# Altium footprint library 电容封装库.PcbLib: 100 footprints (part 2 of 7)
Each footprint in its own frame and in the unit in brackets; x right, y up, seen from the top. Pads: shape width x height; smd on the part's side, far side on the other; paste and mask are expansions set on the pad; w line width, h text height; cw(c..) or ccw(c..) is an arc to the next point about the centre after c.
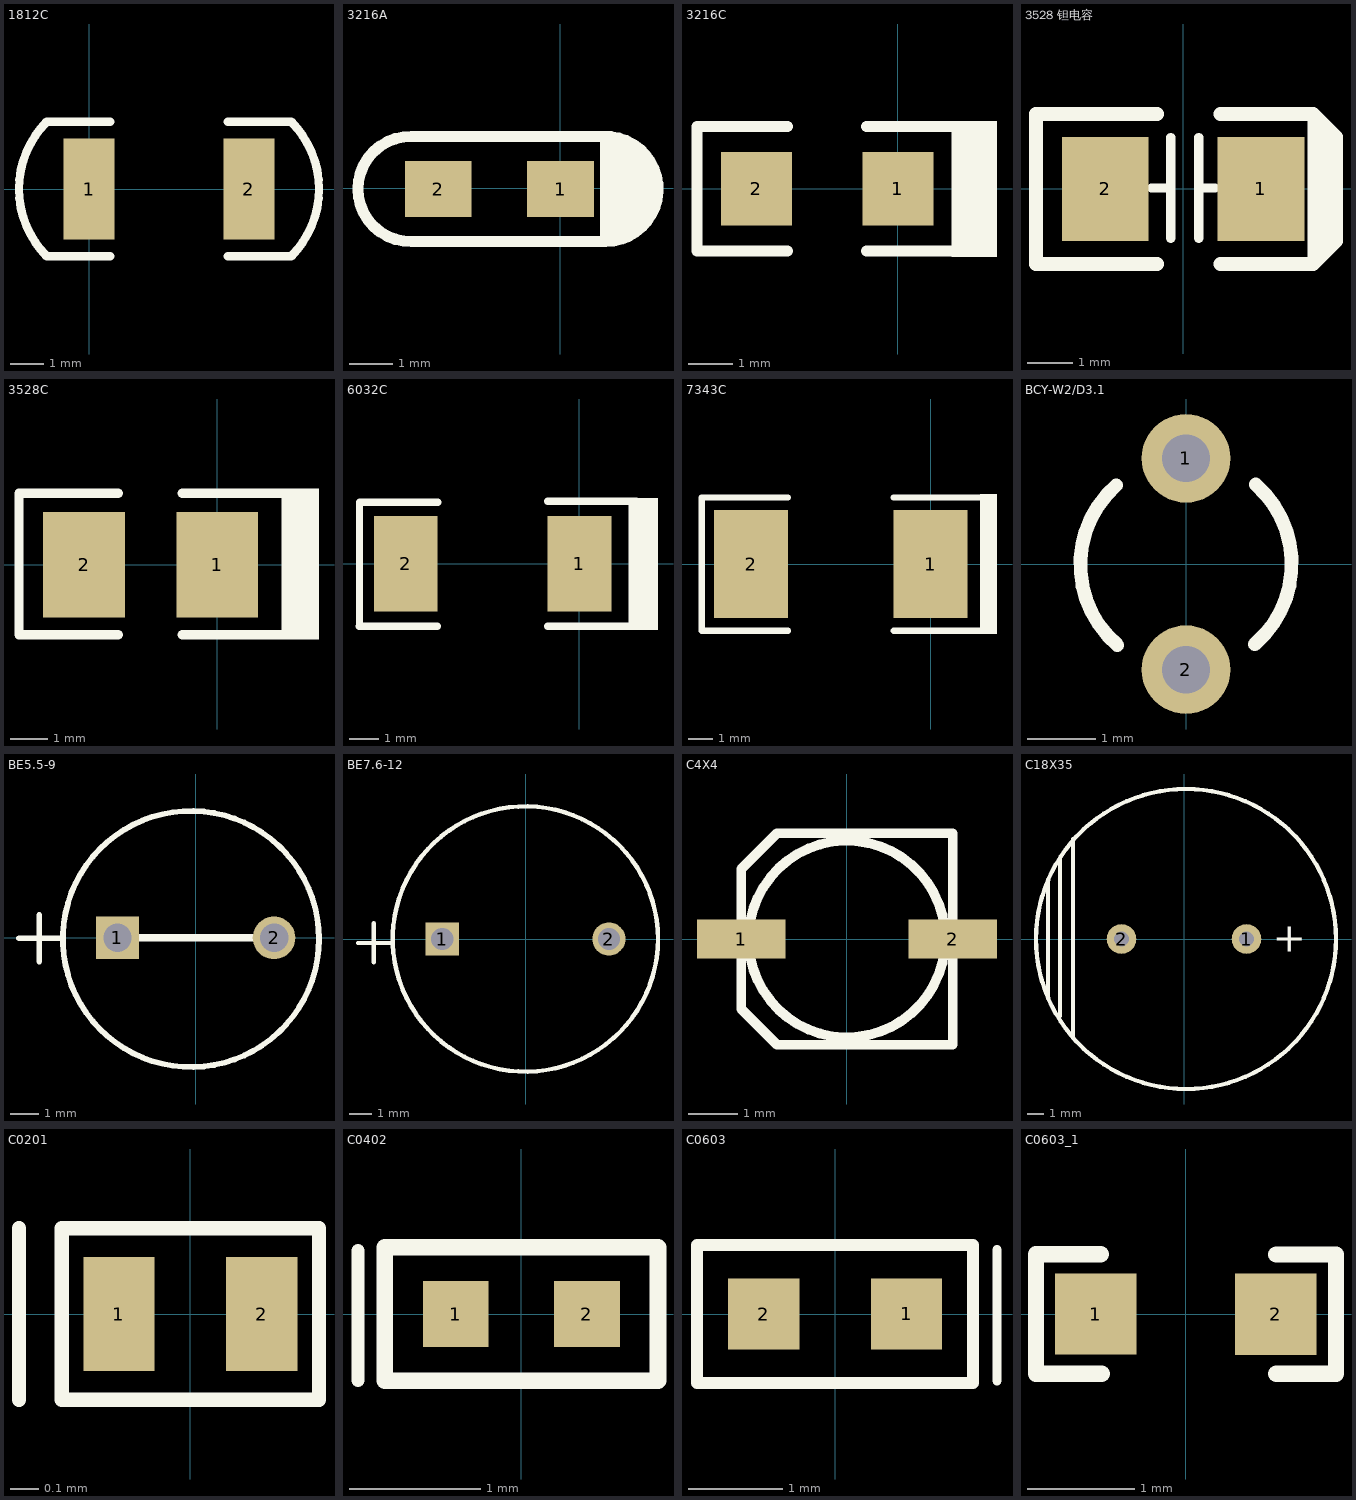
[diagram p1: the footprints below, top view; thin cyan lines are the x and y axes]

## 1812C [mil]
pads (2):
  rect 60x120 smd: 1(0,0) 2(190,0)
Top Overlay:
  lines w10: 25,-80 -50,-80 cw(c30,0) -50,80 25,80 ; 165,-80 240,-80 ccw(c160,0) 240,80 165,80

## 3216A [mil]
pads (2):
  rect 60x50 smd: 1(0.12,-0.87) 2(-109.88,-0.87)
Top Overlay:
  rectangle: 42.44,-41.22 66.07,42.44
  rectangle: 69.02,-10.71 85.75,15.86
  rectangle: 66.06,-32.37 81.81,29.64
  rectangle: 57.2,-37.29 70.98,37.51
  rectangle: 45.39,-44.18 62.13,40.47
  lines w10: -133.74,-48.12 40.47,-48.12 ; -133.75,46.37 39.49,46.37 ; -133.7,-48.11 cw(c-134.72,-0.87) -133.7,46.37 ; 38.23,46.32 cw(c40.47,-0.87) 40.47,-48.12 ; 40.47,44.41 40.47,-48.12

## 3216C [mm]
pads (2):
  rect 1.6x1.65 smd: 1(0,0) 2(-3.175,0)
Top Overlay:
  rectangle: 1.206,-1.537 2.222,1.524
  lines w0.254: -2.476,-1.397 -4.508,-1.397 -4.508,1.397 -2.476,1.397 ; -0.699,-1.397 1.206,-1.397 ; -0.699,1.397 1.206,1.397

## 3528 钽电容 [mil]
height 118.11
pads (2):
  rect 75x90 smd: 1(67.5,0) 2(-67.5,0)
Top Overlay:
  lines w8: -27.38,0.79 -10.65,0.79 ; -10.65,-42.72 -10.65,44.69 ; 13.56,-42.72 13.56,44.69 ; 13.56,0.79 27.74,0.79
  lines w10: 113,-64.5 113,64.5 ; 122.64,-54.86 122.64,54.86
  lines w12: -22.5,-65 -127.5,-65 -127.5,65 -22.5,65 ; 32.5,-65 112.5,-65 ; 32.5,65 112.5,65 ; 113,-64.5 132.5,-45 132.5,45 113,64.5
3D body: height 82.22, standoff -0.46, extent -72.64,-55.51 72.65,55.51

## 3528C [mm]
pads (2):
  rect 2.2x2.85 smd: 1(0,0) 2(-3.581,0)
Top Overlay:
  rectangle: 1.727,-2.015 2.743,2.057
  lines w0.254: -2.667,-1.88 -5.334,-1.88 -5.334,1.93 -2.667,1.93 ; -0.94,-1.88 1.727,-1.88 ; -0.94,1.93 1.727,1.93

## 6032C [mm]
pads (2):
  rect 2.2x3.3 smd: 1(0,0) 2(-6,0)
Top Overlay:
  rectangle: 1.699,-2.29 2.715,2.28
  lines w0.254: -7.605,-2.159 -4.905,-2.159 ; -7.6,-2.133 -7.6,2.133 -4.9,2.133 ; -1.095,-2.159 1.831,-2.159 ; -1.095,2.159 1.958,2.159

## 7343C [mm]
pads (2):
  rect 3x4.4 smd: 1(0,0) 2(-7.3,0)
Top Overlay:
  rectangle: 2.008,-2.835 2.7,2.845
  lines w0.254: -5.8,-2.708 -9.308,-2.708 -9.308,2.708 -5.8,2.708 ; -1.5,-2.708 2.008,-2.708 ; -1.5,2.708 2.008,2.708

## BCY-W2/D3.1 [mm] "Crystal, Thru-Hole; 2 Leads; Body 3.1 x 8.2 mm (Dia.xH)"
pads (2):
  round 1.3 hole 0.7: 1(0,1.55) 2(0,-1.55)
Top Overlay:
  lines w0.2: -1.022,1.155 ccw(c0,-0.01) -1.006,-1.189 ; 1.006,-1.179 ccw(c0,0) 1.022,1.165

## BE5.5-9 [mm]
pads (2):
  rect 1.5x1.5 hole 1: 1(-2.75,0)
  round 1.5 hole 1: 2(2.75,0)
Top Overlay:
  circle w0.2: c-0.17,-0.04 r4.5
  lines w0.2: -6.21,-0.01 -4.71,-0.01 ; -5.5,-0.83 -5.5,0.8
  lines w0.254: -2.75,0 2.75,0

## BE7.6-12 [mm]
pads (2):
  rect 1.5x1.5 hole 1: 1(-3.77,0)
  round 1.5 hole 1: 2(3.77,0)
Top Overlay:
  circle w0.2: c-0.01,0 r6
  lines w0.2: -7.58,-0.18 -6.08,-0.18 ; -6.87,-1.05 -6.87,0.71
3D body: height 7.59, standoff -5.5, extent -6.715,-6.89 6.975,6.801

## C4X4 [mm]
height 5.5
pads (2):
  rect 1.8x0.8 smd: 1(-2.15,0) 2(2.15,0)
Top Overlay:
  circle w0.2: c0,0 r2
  lines w0.2: -1.433,-2.139 -2.15,-1.422 ; -1.433,2.139 -2.15,1.422 ; -2.15,-1.422 -1.422,-2.15 2.15,-2.15 2.15,2.15 -1.422,2.15 -2.15,1.422 ; -2.15,-1.422 -2.15,1.422
3D body: height 5.2, standoff 0, extent -2.286,-2.159 2.314,2.141

## C18X35 [mil]
height 35.43
pads (2):
  round 70 hole 35: 1(147.64,0) 2(-147.64,0)
Top Overlay:
  circle w10: c4.67,0 r354.33
  lines w10: -321,-137 -321,137 ; -293,-182 -293,190 ; -262,-231 -262,236
  text "+" at 210,-30 h68.9
3D body: height 1476.38, standoff -118.11, extent -358.05,-360.23 368.05,365

## C0201 [mm]
height 0.3
pads (2):
  rect 0.25x0.4 smd: 1(-0.25,0) 2(0.25,0)
Top Overlay:
  lines w0.05: -0.6,-0.3 -0.6,0.3 ; -0.45,-0.3 -0.45,0.3 0.45,0.3 0.45,-0.3 -0.45,-0.3
3D body: height 0.3, standoff 0, extent -0.3,-0.153 0.3,0.152

## C0402 [mm]
height 0.5
pads (2):
  rect 0.5x0.5 smd: 1(-0.5,0) 2(0.5,0)
Top Overlay:
  lines w0.1: -1.245,-0.508 -1.245,0.483
  lines w0.127: 0.229,-0.508 1.041,-0.508 ; 1.041,-0.508 1.041,0.508 -1.041,0.508 -1.041,-0.508 1.041,-0.508
3D body: height 0.5, standoff -0.01, extent -0.5,-0.254 0.5,0.256

## C0603 [mil]
height 35.04
pads (2):
  rect 30x30 smd: 1(30,0) 2(-30,0)
Top Overlay:
  lines w3.94: 68,-28 68,27
  lines w5: -58,-29 58,-29 58,29 -58,29 -58,-29
3D body: height 35.28, standoff -0.15, extent -31.99,-15.94 31,15.94

## C0603_1 [mil]
pads (2):
  rect 30x30 smd: 1(-33.16,0.03) 2(33.16,-0.03)
Top Overlay:
  lines w6: -31.35,22.08 -55.17,22.08 -55.17,-22.02 -30.96,-22.02 ; 33.21,-22.02 55.26,-22.02 55.26,21.92 33.21,21.92
3D body: height 11.89, standoff 0, extent -31.1,-14.96 31.89,16.54